# Altium footprint library my_AP_lib_pcb.PcbLib: 115 footprints (part 8 of 8)
Each footprint in its own frame and in the unit in brackets; x right, y up, seen from the top. Pads: shape width x height; smd on the part's side, far side on the other; paste and mask are expansions set on the pad; w line width, h text height; cw(c..) or ccw(c..) is an arc to the next point about the centre after c.
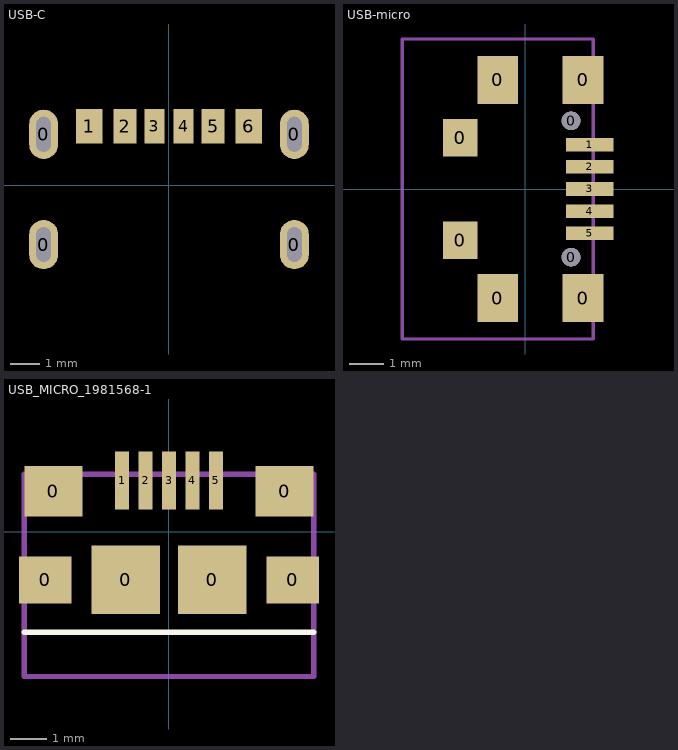
[diagram p7: the footprints below, top view; thin cyan lines are the x and y axes]

## USB-C [mm]
pads (10):
  oval 1x1.7 hole 0.5 slot 1.2 at 90 deg: 0(-4.32,-2.04) 0(-4.32,1.76) 0(4.32,-2.04) 0(4.32,1.76)
  rect 0.9x1.2 smd: 1(-2.75,2.04) 6(2.75,2.04)
  rect 0.8x1.2 smd: 2(-1.52,2.04) 5(1.52,2.04)
  rect 0.7x1.2 smd: 3(-0.5,2.04) 4(0.5,2.04)
3D body "User Library-USB_Type_C_6pin.step": height 3.41, standoff -0.81, extent -4.504,-4.55 4.436,2.25

## USB-micro [mm]
pads (13):
  rect 1x1.1 smd: 0(-1.9,-1.5) 0(-1.9,1.5)
  rect 1.2x1.4 smd: 0(-0.8,-3.2) 0(-0.8,3.2) 0(1.7,-3.2) 0(1.7,3.2)
  round 0.55 hole 0.55 unplated paste+0 mask+0: 0(1.35,-2) 0(1.35,2)
  rect 1.4x0.4 smd: 1(1.9,1.3) 2(1.9,0.65) 3(1.9,0) 4(1.9,-0.65) 5(1.9,-1.3)
Mechanical 15:
  lines w0.1: -3.6,-4.4 -3.6,4.4 2,4.4 2,-4.4 -3.6,-4.4
  text ".Designator" at -3,-0.1 h0.5
3D body "MICRO-USB.stp": height 2.83, standoff -0.23, extent -3.6,-4.4 2,4.4

## USB_MICRO_1981568-1 [mm] "1981568-1"
height 2.51
pads (11):
  rect 1.45x1.3 smd mask+0.07: 0(-3.425,-1.325) 0(3.425,-1.325)
  rect 1.6x1.4 smd mask+0.07: 0(-3.2,1.125) 0(3.2,1.125)
  rect 1.9x1.9 smd mask+0.07: 0(-1.2,-1.325) 0(1.2,-1.325)
  rect 0.4x1.6 smd mask+0.07: 1(-1.3,1.425) 2(-0.65,1.425) 3(0,1.425) 4(0.65,1.425) 5(1.3,1.425)
Top Overlay:
  lines w0.15: -4,-2.775 4,-2.775
Mechanical 15:
  lines w0.15: -4,-4 -4,1.6 4,1.6 4,-4 -4,-4
  text ".Designator" at -2,-0.575 h0.5
3D body "User Library-10118192C.step": height 2.74, standoff -0.27, extent -3.956,-4.036 3.956,1.625